# Altium schematic symbol library jlcpcb_2025_04_capacitors_extended_0402.schlib: 3594 symbols (part 9 of 20) (continued)
## CC0402KRX7R8BB151
designator C?  Capacitance: 150pF  (hidden comment: *)
Capacitor, Ceramic (MLCC), 150pF, ±10%, 25V, X7R, ±10%, SMD 0402; Manufacturer: YAGEO; Manufacturer Part Number: CC0402KRX7R8BB151; Package Size: 0402; JLCPCB Basic Part: No; JLCPCB Part Number: C541384; Supplier 1: LCSC; Category: Capacitors - MLCC; Supplier Part Number 1: C541384; Tolerance: ±10%; Voltage Rating: 25V; Temperature Coefficient: X7R; RoHS: Yes; ComponentLink1Description: Datasheet; ComponentLink1URL: https://wmsc.lcsc.com/wmsc/upload/file/pdf/v2/lcsc/2006151112_YAGEO-CC0402KRX7R8BB151_C541384.pdf; ComponentLink2Description: JLCPCB Part URL; ComponentLink2URL: https://jlcpcb.com/partdetail/C541384; ComponentLink3Description: LCSC Part URL; ComponentLink3URL: https://lcsc.com/product-detail/Multilayer-Ceramic-Capacitors-MLCC---SMD-SMT_YAGEO-YAGEO-CC0402KRX7R8BB151_C541384.html
footprint CAP-0402 (0402 (1005M) Capacitor)
pins: 1, 2

## CC0402KRX7R8BB152
designator C?  Capacitance: 1.5nF  (hidden comment: *)
Capacitor, Ceramic (MLCC), 1.5nF, ±10%, 25V, X7R, ±10%, SMD 0402; Manufacturer: YAGEO; Manufacturer Part Number: CC0402KRX7R8BB152; Package Size: 0402; JLCPCB Basic Part: No; JLCPCB Part Number: C541385; Supplier 1: LCSC; Category: Capacitors - MLCC; Supplier Part Number 1: C541385; Tolerance: ±10%; Voltage Rating: 25V; Temperature Coefficient: X7R; RoHS: Yes; ComponentLink1Description: Datasheet; ComponentLink1URL: https://wmsc.lcsc.com/wmsc/upload/file/pdf/v2/lcsc/2006151132_YAGEO-CC0402KRX7R8BB152_C541385.pdf; ComponentLink2Description: JLCPCB Part URL; ComponentLink2URL: https://jlcpcb.com/partdetail/C541385; ComponentLink3Description: LCSC Part URL; ComponentLink3URL: https://lcsc.com/product-detail/Multilayer-Ceramic-Capacitors-MLCC---SMD-SMT_YAGEO-YAGEO-CC0402KRX7R8BB152_C541385.html
footprint CAP-0402 (0402 (1005M) Capacitor)
pins: 1, 2

## CC0402KRX7R8BB153
designator C?  Capacitance: 15nF  (hidden comment: *)
Capacitor, Ceramic (MLCC), 15nF, ±10%, 25V, X7R, ±10%, SMD 0402; Manufacturer: YAGEO; Manufacturer Part Number: CC0402KRX7R8BB153; Package Size: 0402; JLCPCB Basic Part: No; JLCPCB Part Number: C325466; Supplier 1: LCSC; Category: Capacitors - MLCC; Supplier Part Number 1: C325466; Tolerance: ±10%; Voltage Rating: 25V; Temperature Coefficient: X7R; RoHS: Yes; ComponentLink1Description: Datasheet; ComponentLink1URL: https://wmsc.lcsc.com/wmsc/upload/file/pdf/v2/lcsc/1811070918_YAGEO-CC0402KRX7R8BB153_C325466.pdf; ComponentLink2Description: JLCPCB Part URL; ComponentLink2URL: https://jlcpcb.com/partdetail/C325466; ComponentLink3Description: LCSC Part URL; ComponentLink3URL: https://lcsc.com/product-detail/Multilayer-Ceramic-Capacitors-MLCC---SMD-SMT_YAGEO-YAGEO-CC0402KRX7R8BB153_C325466.html
footprint CAP-0402 (0402 (1005M) Capacitor)
pins: 1, 2

## CC0402KRX7R8BB183
designator C?  Capacitance: 18nF  (hidden comment: *)
Capacitor, Ceramic (MLCC), 18nF, ±10%, 25V, X7R, ±10%, SMD 0402; Manufacturer: YAGEO; Manufacturer Part Number: CC0402KRX7R8BB183; Package Size: 0402; JLCPCB Basic Part: No; JLCPCB Part Number: C576736; Supplier 1: LCSC; Category: Capacitors - MLCC; Supplier Part Number 1: C576736; Tolerance: ±10%; Voltage Rating: 25V; Temperature Coefficient: X7R; RoHS: Yes; ComponentLink1Description: Datasheet; ComponentLink1URL: https://wmsc.lcsc.com/wmsc/upload/file/pdf/v2/lcsc/2304140030_YAGEO-CC0402KRX7R8BB183_C576736.pdf; ComponentLink2Description: JLCPCB Part URL; ComponentLink2URL: https://jlcpcb.com/partdetail/C576736; ComponentLink3Description: LCSC Part URL; ComponentLink3URL: https://lcsc.com/product-detail/Multilayer-Ceramic-Capacitors-MLCC---SMD-SMT_YAGEO-YAGEO-CC0402KRX7R8BB183_C576736.html
footprint CAP-0402 (0402 (1005M) Capacitor)
pins: 1, 2

## CC0402KRX7R8BB221
designator C?  Capacitance: 220pF  (hidden comment: *)
Capacitor, Ceramic (MLCC), 220pF, ±10%, 25V, X7R, ±10%, SMD 0402; Manufacturer: YAGEO; Manufacturer Part Number: CC0402KRX7R8BB221; Package Size: 0402; JLCPCB Basic Part: No; JLCPCB Part Number: C1853178; Supplier 1: LCSC; Category: Capacitors - MLCC; Supplier Part Number 1: C1853178; Tolerance: ±10%; Voltage Rating: 25V; Temperature Coefficient: X7R; RoHS: Yes; ComponentLink1Description: Datasheet; ComponentLink1URL: https://wmsc.lcsc.com/wmsc/upload/file/pdf/v2/lcsc/2201271030_YAGEO-CC0402KRX7R8BB221_C1853178.pdf; ComponentLink2Description: JLCPCB Part URL; ComponentLink2URL: https://jlcpcb.com/partdetail/C1853178; ComponentLink3Description: LCSC Part URL; ComponentLink3URL: https://lcsc.com/product-detail/Multilayer-Ceramic-Capacitors-MLCC---SMD-SMT_YAGEO-YAGEO-CC0402KRX7R8BB221_C1853178.html
footprint CAP-0402 (0402 (1005M) Capacitor)
pins: 1, 2

## CC0402KRX7R8BB222
designator C?  Capacitance: 2.2nF  (hidden comment: *)
Capacitor, Ceramic (MLCC), 2.2nF, ±10%, 25V, X7R, ±10%, SMD 0402; Manufacturer: YAGEO; Manufacturer Part Number: CC0402KRX7R8BB222; Package Size: 0402; JLCPCB Basic Part: No; JLCPCB Part Number: C541386; Supplier 1: LCSC; Category: Capacitors - MLCC; Supplier Part Number 1: C541386; Tolerance: ±10%; Voltage Rating: 25V; Temperature Coefficient: X7R; RoHS: Yes; ComponentLink1Description: Datasheet; ComponentLink1URL: https://wmsc.lcsc.com/wmsc/upload/file/pdf/v2/lcsc/2006151132_YAGEO-CC0402KRX7R8BB222_C541386.pdf; ComponentLink2Description: JLCPCB Part URL; ComponentLink2URL: https://jlcpcb.com/partdetail/C541386; ComponentLink3Description: LCSC Part URL; ComponentLink3URL: https://lcsc.com/product-detail/Multilayer-Ceramic-Capacitors-MLCC---SMD-SMT_YAGEO-YAGEO-CC0402KRX7R8BB222_C541386.html
footprint CAP-0402 (0402 (1005M) Capacitor)
pins: 1, 2

## CC0402KRX7R8BB223
designator C?  Capacitance: 22nF  (hidden comment: *)
Capacitor, Ceramic (MLCC), 22nF, ±10%, 25V, X7R, ±10%, SMD 0402; Manufacturer: YAGEO; Manufacturer Part Number: CC0402KRX7R8BB223; Package Size: 0402; JLCPCB Basic Part: No; JLCPCB Part Number: C107019; Supplier 1: LCSC; Category: Capacitors - MLCC; Supplier Part Number 1: C107019; Tolerance: ±10%; Voltage Rating: 25V; Temperature Coefficient: X7R; RoHS: Yes; ComponentLink1Description: Datasheet; ComponentLink1URL: https://wmsc.lcsc.com/wmsc/upload/file/pdf/v2/lcsc/2304140030_YAGEO-CC0402KRX7R8BB223_C107019.pdf; ComponentLink2Description: JLCPCB Part URL; ComponentLink2URL: https://jlcpcb.com/partdetail/C107019; ComponentLink3Description: LCSC Part URL; ComponentLink3URL: https://lcsc.com/product-detail/Multilayer-Ceramic-Capacitors-MLCC---SMD-SMT_YAGEO-YAGEO-CC0402KRX7R8BB223_C107019.html
footprint CAP-0402 (0402 (1005M) Capacitor)
pins: 1, 2

## CC0402KRX7R8BB224
designator C?  Capacitance: 220nF  (hidden comment: *)
Capacitor, Ceramic (MLCC), 220nF, ±10%, 25V, X7R, ±10%, SMD 0402; Manufacturer: YAGEO; Manufacturer Part Number: CC0402KRX7R8BB224; Package Size: 0402; JLCPCB Basic Part: No; JLCPCB Part Number: C723566; Supplier 1: LCSC; Category: Capacitors - MLCC; Supplier Part Number 1: C723566; Tolerance: ±10%; Voltage Rating: 25V; Temperature Coefficient: X7R; RoHS: Yes; ComponentLink1Description: Datasheet; ComponentLink1URL: https://wmsc.lcsc.com/wmsc/upload/file/pdf/v2/lcsc/2201131100_YAGEO-CC0402KRX7R8BB224_C723566.pdf; ComponentLink2Description: JLCPCB Part URL; ComponentLink2URL: https://jlcpcb.com/partdetail/C723566; ComponentLink3Description: LCSC Part URL; ComponentLink3URL: https://lcsc.com/product-detail/Multilayer-Ceramic-Capacitors-MLCC---SMD-SMT_YAGEO-YAGEO-CC0402KRX7R8BB224_C723566.html
footprint CAP-0402 (0402 (1005M) Capacitor)
pins: 1, 2

## CC0402KRX7R8BB272
designator C?  Capacitance: 2.7nF  (hidden comment: *)
Capacitor, Ceramic (MLCC), 2.7nF, ±10%, 25V, X7R, ±10%, SMD 0402; Manufacturer: YAGEO; Manufacturer Part Number: CC0402KRX7R8BB272; Package Size: 0402; JLCPCB Basic Part: No; JLCPCB Part Number: C541392; Supplier 1: LCSC; Category: Capacitors - MLCC; Supplier Part Number 1: C541392; Tolerance: ±10%; Voltage Rating: 25V; Temperature Coefficient: X7R; RoHS: Yes; ComponentLink1Description: Datasheet; ComponentLink1URL: https://wmsc.lcsc.com/wmsc/upload/file/pdf/v2/lcsc/2006151133_YAGEO-CC0402KRX7R8BB272_C541392.pdf; ComponentLink2Description: JLCPCB Part URL; ComponentLink2URL: https://jlcpcb.com/partdetail/C541392; ComponentLink3Description: LCSC Part URL; ComponentLink3URL: https://lcsc.com/product-detail/Multilayer-Ceramic-Capacitors-MLCC---SMD-SMT_YAGEO-YAGEO-CC0402KRX7R8BB272_C541392.html
footprint CAP-0402 (0402 (1005M) Capacitor)
pins: 1, 2

## CC0402KRX7R8BB273
designator C?  Capacitance: 27nF  (hidden comment: *)
Capacitor, Ceramic (MLCC), 27nF, ±10%, 25V, X7R, ±10%, SMD 0402; Manufacturer: YAGEO; Manufacturer Part Number: CC0402KRX7R8BB273; Package Size: 0402; JLCPCB Basic Part: No; JLCPCB Part Number: C513396; Supplier 1: LCSC; Category: Capacitors - MLCC; Supplier Part Number 1: C513396; Tolerance: ±10%; Voltage Rating: 25V; Temperature Coefficient: X7R; RoHS: Yes; ComponentLink1Description: Datasheet; ComponentLink1URL: https://wmsc.lcsc.com/wmsc/upload/file/pdf/v2/lcsc/2004231432_YAGEO-CC0402KRX7R8BB273_C513396.pdf; ComponentLink2Description: JLCPCB Part URL; ComponentLink2URL: https://jlcpcb.com/partdetail/C513396; ComponentLink3Description: LCSC Part URL; ComponentLink3URL: https://lcsc.com/product-detail/Multilayer-Ceramic-Capacitors-MLCC---SMD-SMT_YAGEO-YAGEO-CC0402KRX7R8BB273_C513396.html
footprint CAP-0402 (0402 (1005M) Capacitor)
pins: 1, 2

## CC0402KRX7R8BB332
designator C?  Capacitance: 3.3nF  (hidden comment: *)
Capacitor, Ceramic (MLCC), 3.3nF, ±10%, 25V, X7R, ±10%, SMD 0402; Manufacturer: YAGEO; Manufacturer Part Number: CC0402KRX7R8BB332; Package Size: 0402; JLCPCB Basic Part: No; JLCPCB Part Number: C272874; Supplier 1: LCSC; Category: Capacitors - MLCC; Supplier Part Number 1: C272874; Tolerance: ±10%; Voltage Rating: 25V; Temperature Coefficient: X7R; RoHS: Yes; ComponentLink1Description: Datasheet; ComponentLink1URL: https://wmsc.lcsc.com/wmsc/upload/file/pdf/v2/lcsc/2304140030_YAGEO-CC0402KRX7R8BB332_C272874.pdf; ComponentLink2Description: JLCPCB Part URL; ComponentLink2URL: https://jlcpcb.com/partdetail/C272874; ComponentLink3Description: LCSC Part URL; ComponentLink3URL: https://lcsc.com/product-detail/Multilayer-Ceramic-Capacitors-MLCC---SMD-SMT_YAGEO-YAGEO-CC0402KRX7R8BB332_C272874.html
footprint CAP-0402 (0402 (1005M) Capacitor)
pins: 1, 2

## CC0402KRX7R8BB333
designator C?  Capacitance: 33nF  (hidden comment: *)
Capacitor, Ceramic (MLCC), 33nF, ±10%, 25V, X7R, ±10%, SMD 0402; Manufacturer: YAGEO; Manufacturer Part Number: CC0402KRX7R8BB333; Package Size: 0402; JLCPCB Basic Part: No; JLCPCB Part Number: C326974; Supplier 1: LCSC; Category: Capacitors - MLCC; Supplier Part Number 1: C326974; Tolerance: ±10%; Voltage Rating: 25V; Temperature Coefficient: X7R; RoHS: Yes; ComponentLink1Description: Datasheet; ComponentLink1URL: https://wmsc.lcsc.com/wmsc/upload/file/pdf/v2/lcsc/1811141234_YAGEO-CC0402KRX7R8BB333_C326974.pdf; ComponentLink2Description: JLCPCB Part URL; ComponentLink2URL: https://jlcpcb.com/partdetail/C326974; ComponentLink3Description: LCSC Part URL; ComponentLink3URL: https://lcsc.com/product-detail/Multilayer-Ceramic-Capacitors-MLCC---SMD-SMT_YAGEO-YAGEO-CC0402KRX7R8BB333_C326974.html
footprint CAP-0402 (0402 (1005M) Capacitor)
pins: 1, 2

## CC0402KRX7R8BB392
designator C?  Capacitance: 3.9nF  (hidden comment: *)
Capacitor, Ceramic (MLCC), 3.9nF, ±10%, 25V, X7R, ±10%, SMD 0402; Manufacturer: YAGEO; Manufacturer Part Number: CC0402KRX7R8BB392; Package Size: 0402; JLCPCB Basic Part: No; JLCPCB Part Number: C113787; Supplier 1: LCSC; Category: Capacitors - MLCC; Supplier Part Number 1: C113787; Tolerance: ±10%; Voltage Rating: 25V; Temperature Coefficient: X7R; RoHS: Yes; ComponentLink1Description: Datasheet; ComponentLink1URL: https://wmsc.lcsc.com/wmsc/upload/file/pdf/v2/lcsc/2304140030_YAGEO-CC0402KRX7R8BB392_C113787.pdf; ComponentLink2Description: JLCPCB Part URL; ComponentLink2URL: https://jlcpcb.com/partdetail/C113787; ComponentLink3Description: LCSC Part URL; ComponentLink3URL: https://lcsc.com/product-detail/Multilayer-Ceramic-Capacitors-MLCC---SMD-SMT_YAGEO-YAGEO-CC0402KRX7R8BB392_C113787.html
footprint CAP-0402 (0402 (1005M) Capacitor)
pins: 1, 2

## CC0402KRX7R8BB393
designator C?  Capacitance: 39nF  (hidden comment: *)
Capacitor, Ceramic (MLCC), 39nF, ±10%, 25V, X7R, ±10%, SMD 0402; Manufacturer: YAGEO; Manufacturer Part Number: CC0402KRX7R8BB393; Package Size: 0402; JLCPCB Basic Part: No; JLCPCB Part Number: C576737; Supplier 1: LCSC; Category: Capacitors - MLCC; Supplier Part Number 1: C576737; Tolerance: ±10%; Voltage Rating: 25V; Temperature Coefficient: X7R; RoHS: Yes; ComponentLink1Description: Datasheet; ComponentLink1URL: https://wmsc.lcsc.com/wmsc/upload/file/pdf/v2/lcsc/2204021130_YAGEO-CC0402KRX7R8BB393_C576737.pdf; ComponentLink2Description: JLCPCB Part URL; ComponentLink2URL: https://jlcpcb.com/partdetail/C576737; ComponentLink3Description: LCSC Part URL; ComponentLink3URL: https://lcsc.com/product-detail/Multilayer-Ceramic-Capacitors-MLCC---SMD-SMT_YAGEO-YAGEO-CC0402KRX7R8BB393_C576737.html
footprint CAP-0402 (0402 (1005M) Capacitor)
pins: 1, 2

## CC0402KRX7R8BB471
designator C?  Capacitance: 470pF  (hidden comment: *)
Capacitor, Ceramic (MLCC), 470pF, ±10%, 25V, X7R, ±10%, SMD 0402; Manufacturer: YAGEO; Manufacturer Part Number: CC0402KRX7R8BB471; Package Size: 0402; JLCPCB Basic Part: No; JLCPCB Part Number: C541387; Supplier 1: LCSC; Category: Capacitors - MLCC; Supplier Part Number 1: C541387; Tolerance: ±10%; Voltage Rating: 25V; Temperature Coefficient: X7R; RoHS: Yes; ComponentLink1Description: Datasheet; ComponentLink1URL: https://wmsc.lcsc.com/wmsc/upload/file/pdf/v2/lcsc/2006151132_YAGEO-CC0402KRX7R8BB471_C541387.pdf; ComponentLink2Description: JLCPCB Part URL; ComponentLink2URL: https://jlcpcb.com/partdetail/C541387; ComponentLink3Description: LCSC Part URL; ComponentLink3URL: https://lcsc.com/product-detail/Multilayer-Ceramic-Capacitors-MLCC---SMD-SMT_YAGEO-YAGEO-CC0402KRX7R8BB471_C541387.html
footprint CAP-0402 (0402 (1005M) Capacitor)
pins: 1, 2

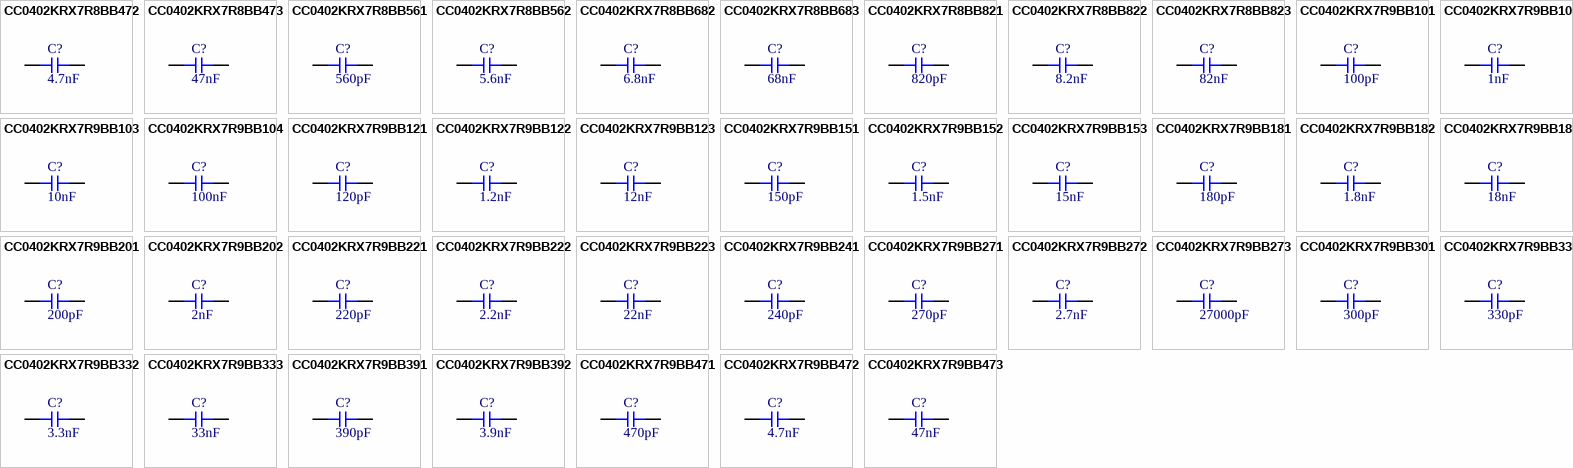
[diagram p40: symbols CC0402KRX7R8BB472 to CC0402KRX7R9BB473]

## CC0402KRX7R8BB472
designator C?  Capacitance: 4.7nF  (hidden comment: *)
Capacitor, Ceramic (MLCC), 4.7nF, ±10%, 25V, X7R, ±10%, SMD 0402; Manufacturer: YAGEO; Manufacturer Part Number: CC0402KRX7R8BB472; Package Size: 0402; JLCPCB Basic Part: No; JLCPCB Part Number: C181747; Supplier 1: LCSC; Category: Capacitors - MLCC; Supplier Part Number 1: C181747; Tolerance: ±10%; Voltage Rating: 25V; Temperature Coefficient: X7R; RoHS: Yes; ComponentLink1Description: Datasheet; ComponentLink1URL: https://wmsc.lcsc.com/wmsc/upload/file/pdf/v2/lcsc/1811091032_YAGEO-CC0402KRX7R8BB472_C181747.pdf; ComponentLink2Description: JLCPCB Part URL; ComponentLink2URL: https://jlcpcb.com/partdetail/C181747; ComponentLink3Description: LCSC Part URL; ComponentLink3URL: https://lcsc.com/product-detail/Multilayer-Ceramic-Capacitors-MLCC---SMD-SMT_YAGEO-YAGEO-CC0402KRX7R8BB472_C181747.html
footprint CAP-0402 (0402 (1005M) Capacitor)
pins: 1, 2

## CC0402KRX7R8BB473
designator C?  Capacitance: 47nF  (hidden comment: *)
Capacitor, Ceramic (MLCC), 47nF, ±10%, 25V, X7R, ±10%, SMD 0402; Manufacturer: YAGEO; Manufacturer Part Number: CC0402KRX7R8BB473; Package Size: 0402; JLCPCB Basic Part: No; JLCPCB Part Number: C107020; Supplier 1: LCSC; Category: Capacitors - MLCC; Supplier Part Number 1: C107020; Tolerance: ±10%; Voltage Rating: 25V; Temperature Coefficient: X7R; RoHS: Yes; ComponentLink1Description: Datasheet; ComponentLink1URL: https://wmsc.lcsc.com/wmsc/upload/file/pdf/v2/lcsc/2304140030_YAGEO-CC0402KRX7R8BB473_C107020.pdf; ComponentLink2Description: JLCPCB Part URL; ComponentLink2URL: https://jlcpcb.com/partdetail/C107020; ComponentLink3Description: LCSC Part URL; ComponentLink3URL: https://lcsc.com/product-detail/Multilayer-Ceramic-Capacitors-MLCC---SMD-SMT_YAGEO-YAGEO-CC0402KRX7R8BB473_C107020.html
footprint CAP-0402 (0402 (1005M) Capacitor)
pins: 1, 2

## CC0402KRX7R8BB561
designator C?  Capacitance: 560pF  (hidden comment: *)
Capacitor, Ceramic (MLCC), 560pF, ±10%, 25V, X7R, ±10%, SMD 0402; Manufacturer: YAGEO; Manufacturer Part Number: CC0402KRX7R8BB561; Package Size: 0402; JLCPCB Basic Part: No; JLCPCB Part Number: C527016; Supplier 1: LCSC; Category: Capacitors - MLCC; Supplier Part Number 1: C527016; Tolerance: ±10%; Voltage Rating: 25V; Temperature Coefficient: X7R; RoHS: Yes; ComponentLink1Description: Datasheet; ComponentLink1URL: https://wmsc.lcsc.com/wmsc/upload/file/pdf/v2/lcsc/2006031835_YAGEO-CC0402KRX7R8BB561_C527016.pdf; ComponentLink2Description: JLCPCB Part URL; ComponentLink2URL: https://jlcpcb.com/partdetail/C527016; ComponentLink3Description: LCSC Part URL; ComponentLink3URL: https://lcsc.com/product-detail/Multilayer-Ceramic-Capacitors-MLCC---SMD-SMT_YAGEO-YAGEO-CC0402KRX7R8BB561_C527016.html
footprint CAP-0402 (0402 (1005M) Capacitor)
pins: 1, 2

## CC0402KRX7R8BB562
designator C?  Capacitance: 5.6nF  (hidden comment: *)
Capacitor, Ceramic (MLCC), 5.6nF, ±10%, 25V, X7R, ±10%, SMD 0402; Manufacturer: YAGEO; Manufacturer Part Number: CC0402KRX7R8BB562; Package Size: 0402; JLCPCB Basic Part: No; JLCPCB Part Number: C527017; Supplier 1: LCSC; Category: Capacitors - MLCC; Supplier Part Number 1: C527017; Tolerance: ±10%; Voltage Rating: 25V; Temperature Coefficient: X7R; RoHS: Yes; ComponentLink1Description: Datasheet; ComponentLink1URL: https://wmsc.lcsc.com/wmsc/upload/file/pdf/v2/lcsc/2007091834_YAGEO-CC0402KRX7R8BB562_C527017.pdf; ComponentLink2Description: JLCPCB Part URL; ComponentLink2URL: https://jlcpcb.com/partdetail/C527017; ComponentLink3Description: LCSC Part URL; ComponentLink3URL: https://lcsc.com/product-detail/Multilayer-Ceramic-Capacitors-MLCC---SMD-SMT_YAGEO-YAGEO-CC0402KRX7R8BB562_C527017.html
footprint CAP-0402 (0402 (1005M) Capacitor)
pins: 1, 2

## CC0402KRX7R8BB682
designator C?  Capacitance: 6.8nF  (hidden comment: *)
Capacitor, Ceramic (MLCC), 6.8nF, ±10%, 25V, X7R, ±10%, SMD 0402; Manufacturer: YAGEO; Manufacturer Part Number: CC0402KRX7R8BB682; Package Size: 0402; JLCPCB Basic Part: No; JLCPCB Part Number: C541388; Supplier 1: LCSC; Category: Capacitors - MLCC; Supplier Part Number 1: C541388; Tolerance: ±10%; Voltage Rating: 25V; Temperature Coefficient: X7R; RoHS: Yes; ComponentLink1Description: Datasheet; ComponentLink1URL: https://wmsc.lcsc.com/wmsc/upload/file/pdf/v2/lcsc/2006151132_YAGEO-CC0402KRX7R8BB682_C541388.pdf; ComponentLink2Description: JLCPCB Part URL; ComponentLink2URL: https://jlcpcb.com/partdetail/C541388; ComponentLink3Description: LCSC Part URL; ComponentLink3URL: https://lcsc.com/product-detail/Multilayer-Ceramic-Capacitors-MLCC---SMD-SMT_YAGEO-YAGEO-CC0402KRX7R8BB682_C541388.html
footprint CAP-0402 (0402 (1005M) Capacitor)
pins: 1, 2

## CC0402KRX7R8BB683
designator C?  Capacitance: 68nF  (hidden comment: *)
Capacitor, Ceramic (MLCC), 68nF, ±10%, 25V, X7R, ±10%, SMD 0402; Manufacturer: YAGEO; Manufacturer Part Number: CC0402KRX7R8BB683; Package Size: 0402; JLCPCB Basic Part: No; JLCPCB Part Number: C325467; Supplier 1: LCSC; Category: Capacitors - MLCC; Supplier Part Number 1: C325467; Tolerance: ±10%; Voltage Rating: 25V; Temperature Coefficient: X7R; RoHS: Yes; ComponentLink1Description: Datasheet; ComponentLink1URL: https://wmsc.lcsc.com/wmsc/upload/file/pdf/v2/lcsc/1811070918_YAGEO-CC0402KRX7R8BB683_C325467.pdf; ComponentLink2Description: JLCPCB Part URL; ComponentLink2URL: https://jlcpcb.com/partdetail/C325467; ComponentLink3Description: LCSC Part URL; ComponentLink3URL: https://lcsc.com/product-detail/Multilayer-Ceramic-Capacitors-MLCC---SMD-SMT_YAGEO-YAGEO-CC0402KRX7R8BB683_C325467.html
footprint CAP-0402 (0402 (1005M) Capacitor)
pins: 1, 2

## CC0402KRX7R8BB821
designator C?  Capacitance: 820pF  (hidden comment: *)
Capacitor, Ceramic (MLCC), 820pF, ±10%, 25V, X7R, ±10%, SMD 0402; Manufacturer: YAGEO; Manufacturer Part Number: CC0402KRX7R8BB821; Package Size: 0402; JLCPCB Basic Part: No; JLCPCB Part Number: C527018; Supplier 1: LCSC; Category: Capacitors - MLCC; Supplier Part Number 1: C527018; Tolerance: ±10%; Voltage Rating: 25V; Temperature Coefficient: X7R; RoHS: Yes; ComponentLink1Description: Datasheet; ComponentLink1URL: https://wmsc.lcsc.com/wmsc/upload/file/pdf/v2/lcsc/2006101834_YAGEO-CC0402KRX7R8BB821_C527018.pdf; ComponentLink2Description: JLCPCB Part URL; ComponentLink2URL: https://jlcpcb.com/partdetail/C527018; ComponentLink3Description: LCSC Part URL; ComponentLink3URL: https://lcsc.com/product-detail/Multilayer-Ceramic-Capacitors-MLCC---SMD-SMT_YAGEO-YAGEO-CC0402KRX7R8BB821_C527018.html
footprint CAP-0402 (0402 (1005M) Capacitor)
pins: 1, 2

## CC0402KRX7R8BB822
designator C?  Capacitance: 8.2nF  (hidden comment: *)
Capacitor, Ceramic (MLCC), 8.2nF, ±10%, 25V, X7R, ±10%, SMD 0402; Manufacturer: YAGEO; Manufacturer Part Number: CC0402KRX7R8BB822; Package Size: 0402; JLCPCB Basic Part: No; JLCPCB Part Number: C527019; Supplier 1: LCSC; Category: Capacitors - MLCC; Supplier Part Number 1: C527019; Tolerance: ±10%; Voltage Rating: 25V; Temperature Coefficient: X7R; RoHS: Yes; ComponentLink1Description: Datasheet; ComponentLink1URL: https://wmsc.lcsc.com/wmsc/upload/file/pdf/v2/lcsc/2006031835_YAGEO-CC0402KRX7R8BB822_C527019.pdf; ComponentLink2Description: JLCPCB Part URL; ComponentLink2URL: https://jlcpcb.com/partdetail/C527019; ComponentLink3Description: LCSC Part URL; ComponentLink3URL: https://lcsc.com/product-detail/Multilayer-Ceramic-Capacitors-MLCC---SMD-SMT_YAGEO-YAGEO-CC0402KRX7R8BB822_C527019.html
footprint CAP-0402 (0402 (1005M) Capacitor)
pins: 1, 2

## CC0402KRX7R8BB823
designator C?  Capacitance: 82nF  (hidden comment: *)
Capacitor, Ceramic (MLCC), 82nF, ±10%, 25V, X7R, ±10%, SMD 0402; Manufacturer: YAGEO; Manufacturer Part Number: CC0402KRX7R8BB823; Package Size: 0402; JLCPCB Basic Part: No; JLCPCB Part Number: C576738; Supplier 1: LCSC; Category: Capacitors - MLCC; Supplier Part Number 1: C576738; Tolerance: ±10%; Voltage Rating: 25V; Temperature Coefficient: X7R; RoHS: Yes; ComponentLink1Description: Datasheet; ComponentLink1URL: https://wmsc.lcsc.com/wmsc/upload/file/pdf/v2/lcsc/2009261808_YAGEO-CC0402KRX7R8BB823_C576738.pdf; ComponentLink2Description: JLCPCB Part URL; ComponentLink2URL: https://jlcpcb.com/partdetail/C576738; ComponentLink3Description: LCSC Part URL; ComponentLink3URL: https://lcsc.com/product-detail/Multilayer-Ceramic-Capacitors-MLCC---SMD-SMT_YAGEO-YAGEO-CC0402KRX7R8BB823_C576738.html
footprint CAP-0402 (0402 (1005M) Capacitor)
pins: 1, 2

## CC0402KRX7R9BB101
designator C?  Capacitance: 100pF  (hidden comment: *)
Capacitor, Ceramic (MLCC), 100pF, ±10%, 50V, X7R, ±10%, SMD 0402; Manufacturer: YAGEO; Manufacturer Part Number: CC0402KRX7R9BB101; Package Size: 0402; JLCPCB Basic Part: No; JLCPCB Part Number: C281751; Supplier 1: LCSC; Category: Capacitors - MLCC; Supplier Part Number 1: C281751; Tolerance: ±10%; Voltage Rating: 50V; Temperature Coefficient: X7R; RoHS: Yes; ComponentLink1Description: Datasheet; ComponentLink1URL: https://wmsc.lcsc.com/wmsc/upload/file/pdf/v2/lcsc/2304140030_YAGEO-CC0402KRX7R9BB101_C281751.pdf; ComponentLink2Description: JLCPCB Part URL; ComponentLink2URL: https://jlcpcb.com/partdetail/C281751; ComponentLink3Description: LCSC Part URL; ComponentLink3URL: https://lcsc.com/product-detail/Multilayer-Ceramic-Capacitors-MLCC---SMD-SMT_YAGEO-YAGEO-CC0402KRX7R9BB101_C281751.html
footprint CAP-0402 (0402 (1005M) Capacitor)
pins: 1, 2

## CC0402KRX7R9BB102
designator C?  Capacitance: 1nF  (hidden comment: *)
Capacitor, Ceramic (MLCC), 1nF, ±10%, 50V, X7R, ±10%, SMD 0402; Manufacturer: YAGEO; Manufacturer Part Number: CC0402KRX7R9BB102; Package Size: 0402; JLCPCB Basic Part: No; JLCPCB Part Number: C106205; Supplier 1: LCSC; Category: Capacitors - MLCC; Supplier Part Number 1: C106205; Tolerance: ±10%; Voltage Rating: 50V; Temperature Coefficient: X7R; RoHS: Yes; ComponentLink1Description: Datasheet; ComponentLink1URL: https://wmsc.lcsc.com/wmsc/upload/file/pdf/v2/lcsc/2304140030_YAGEO-CC0402KRX7R9BB102_C106205.pdf; ComponentLink2Description: JLCPCB Part URL; ComponentLink2URL: https://jlcpcb.com/partdetail/C106205; ComponentLink3Description: LCSC Part URL; ComponentLink3URL: https://lcsc.com/product-detail/Multilayer-Ceramic-Capacitors-MLCC---SMD-SMT_YAGEO-YAGEO-CC0402KRX7R9BB102_C106205.html
footprint CAP-0402 (0402 (1005M) Capacitor)
pins: 1, 2

## CC0402KRX7R9BB103
designator C?  Capacitance: 10nF  (hidden comment: *)
Capacitor, Ceramic (MLCC), 10nF, ±10%, 50V, X7R, ±10%, SMD 0402; Manufacturer: YAGEO; Manufacturer Part Number: CC0402KRX7R9BB103; Package Size: 0402; JLCPCB Basic Part: No; JLCPCB Part Number: C60133; Supplier 1: LCSC; Category: Capacitors - MLCC; Supplier Part Number 1: C60133; Tolerance: ±10%; Voltage Rating: 50V; Temperature Coefficient: X7R; RoHS: Yes; ComponentLink1Description: Datasheet; ComponentLink1URL: https://wmsc.lcsc.com/wmsc/upload/file/pdf/v2/lcsc/2304140030_YAGEO-CC0402KRX7R9BB103_C60133.pdf; ComponentLink2Description: JLCPCB Part URL; ComponentLink2URL: https://jlcpcb.com/partdetail/C60133; ComponentLink3Description: LCSC Part URL; ComponentLink3URL: https://lcsc.com/product-detail/Multilayer-Ceramic-Capacitors-MLCC---SMD-SMT_YAGEO-YAGEO-CC0402KRX7R9BB103_C60133.html
footprint CAP-0402 (0402 (1005M) Capacitor)
pins: 1, 2

## CC0402KRX7R9BB104
designator C?  Capacitance: 100nF  (hidden comment: *)
Capacitor, Ceramic (MLCC), 100nF, ±10%, 50V, X7R, ±10%, SMD 0402; Manufacturer: YAGEO; Manufacturer Part Number: CC0402KRX7R9BB104; Package Size: 0402; JLCPCB Basic Part: No; JLCPCB Part Number: C131394; Supplier 1: LCSC; Category: Capacitors - MLCC; Supplier Part Number 1: C131394; Tolerance: ±10%; Voltage Rating: 50V; Temperature Coefficient: X7R; RoHS: Yes; ComponentLink1Description: Datasheet; ComponentLink1URL: https://wmsc.lcsc.com/wmsc/upload/file/pdf/v2/lcsc/2304140030_YAGEO-CC0402KRX7R9BB104_C131394.pdf; ComponentLink2Description: JLCPCB Part URL; ComponentLink2URL: https://jlcpcb.com/partdetail/C131394; ComponentLink3Description: LCSC Part URL; ComponentLink3URL: https://lcsc.com/product-detail/Multilayer-Ceramic-Capacitors-MLCC---SMD-SMT_YAGEO-YAGEO-CC0402KRX7R9BB104_C131394.html
footprint CAP-0402 (0402 (1005M) Capacitor)
pins: 1, 2

## CC0402KRX7R9BB121
designator C?  Capacitance: 120pF  (hidden comment: *)
Capacitor, Ceramic (MLCC), 120pF, ±10%, 50V, X7R, ±10%, SMD 0402; Manufacturer: YAGEO; Manufacturer Part Number: CC0402KRX7R9BB121; Package Size: 0402; JLCPCB Basic Part: No; JLCPCB Part Number: C113788; Supplier 1: LCSC; Category: Capacitors - MLCC; Supplier Part Number 1: C113788; Tolerance: ±10%; Voltage Rating: 50V; Temperature Coefficient: X7R; RoHS: Yes; ComponentLink1Description: Datasheet; ComponentLink1URL: https://wmsc.lcsc.com/wmsc/upload/file/pdf/v2/lcsc/2304140030_YAGEO-CC0402KRX7R9BB121_C113788.pdf; ComponentLink2Description: JLCPCB Part URL; ComponentLink2URL: https://jlcpcb.com/partdetail/C113788; ComponentLink3Description: LCSC Part URL; ComponentLink3URL: https://lcsc.com/product-detail/Multilayer-Ceramic-Capacitors-MLCC---SMD-SMT_YAGEO-YAGEO-CC0402KRX7R9BB121_C113788.html
footprint CAP-0402 (0402 (1005M) Capacitor)
pins: 1, 2

## CC0402KRX7R9BB122
designator C?  Capacitance: 1.2nF  (hidden comment: *)
Capacitor, Ceramic (MLCC), 1.2nF, ±10%, 50V, X7R, ±10%, SMD 0402; Manufacturer: YAGEO; Manufacturer Part Number: CC0402KRX7R9BB122; Package Size: 0402; JLCPCB Basic Part: No; JLCPCB Part Number: C107021; Supplier 1: LCSC; Category: Capacitors - MLCC; Supplier Part Number 1: C107021; Tolerance: ±10%; Voltage Rating: 50V; Temperature Coefficient: X7R; RoHS: Yes; ComponentLink1Description: Datasheet; ComponentLink1URL: https://wmsc.lcsc.com/wmsc/upload/file/pdf/v2/lcsc/2304140030_YAGEO-CC0402KRX7R9BB122_C107021.pdf; ComponentLink2Description: JLCPCB Part URL; ComponentLink2URL: https://jlcpcb.com/partdetail/C107021; ComponentLink3Description: LCSC Part URL; ComponentLink3URL: https://lcsc.com/product-detail/Multilayer-Ceramic-Capacitors-MLCC---SMD-SMT_YAGEO-YAGEO-CC0402KRX7R9BB122_C107021.html
footprint CAP-0402 (0402 (1005M) Capacitor)
pins: 1, 2

## CC0402KRX7R9BB123
designator C?  Capacitance: 12nF  (hidden comment: *)
Capacitor, Ceramic (MLCC), 12nF, ±10%, 50V, X7R, ±10%, SMD 0402; Manufacturer: YAGEO; Manufacturer Part Number: CC0402KRX7R9BB123; Package Size: 0402; JLCPCB Basic Part: No; JLCPCB Part Number: C576739; Supplier 1: LCSC; Category: Capacitors - MLCC; Supplier Part Number 1: C576739; Tolerance: ±10%; Voltage Rating: 50V; Temperature Coefficient: X7R; RoHS: Yes; ComponentLink1Description: Datasheet; ComponentLink1URL: https://wmsc.lcsc.com/wmsc/upload/file/pdf/v2/lcsc/2204021130_YAGEO-CC0402KRX7R9BB123_C576739.pdf; ComponentLink2Description: JLCPCB Part URL; ComponentLink2URL: https://jlcpcb.com/partdetail/C576739; ComponentLink3Description: LCSC Part URL; ComponentLink3URL: https://lcsc.com/product-detail/Multilayer-Ceramic-Capacitors-MLCC---SMD-SMT_YAGEO-YAGEO-CC0402KRX7R9BB123_C576739.html
footprint CAP-0402 (0402 (1005M) Capacitor)
pins: 1, 2

## CC0402KRX7R9BB151
designator C?  Capacitance: 150pF  (hidden comment: *)
Capacitor, Ceramic (MLCC), 150pF, ±10%, 50V, X7R, ±10%, SMD 0402; Manufacturer: YAGEO; Manufacturer Part Number: CC0402KRX7R9BB151; Package Size: 0402; JLCPCB Basic Part: No; JLCPCB Part Number: C113789; Supplier 1: LCSC; Category: Capacitors - MLCC; Supplier Part Number 1: C113789; Tolerance: ±10%; Voltage Rating: 50V; Temperature Coefficient: X7R; RoHS: Yes; ComponentLink1Description: Datasheet; ComponentLink1URL: https://wmsc.lcsc.com/wmsc/upload/file/pdf/v2/lcsc/2304140030_YAGEO-CC0402KRX7R9BB151_C113789.pdf; ComponentLink2Description: JLCPCB Part URL; ComponentLink2URL: https://jlcpcb.com/partdetail/C113789; ComponentLink3Description: LCSC Part URL; ComponentLink3URL: https://lcsc.com/product-detail/Multilayer-Ceramic-Capacitors-MLCC---SMD-SMT_YAGEO-YAGEO-CC0402KRX7R9BB151_C113789.html
footprint CAP-0402 (0402 (1005M) Capacitor)
pins: 1, 2

## CC0402KRX7R9BB152
designator C?  Capacitance: 1.5nF  (hidden comment: *)
Capacitor, Ceramic (MLCC), 1.5nF, ±10%, 50V, X7R, ±10%, SMD 0402; Manufacturer: YAGEO; Manufacturer Part Number: CC0402KRX7R9BB152; Package Size: 0402; JLCPCB Basic Part: No; JLCPCB Part Number: C107022; Supplier 1: LCSC; Category: Capacitors - MLCC; Supplier Part Number 1: C107022; Tolerance: ±10%; Voltage Rating: 50V; Temperature Coefficient: X7R; RoHS: Yes; ComponentLink1Description: Datasheet; ComponentLink1URL: https://wmsc.lcsc.com/wmsc/upload/file/pdf/v2/lcsc/2304140030_YAGEO-CC0402KRX7R9BB152_C107022.pdf; ComponentLink2Description: JLCPCB Part URL; ComponentLink2URL: https://jlcpcb.com/partdetail/C107022; ComponentLink3Description: LCSC Part URL; ComponentLink3URL: https://lcsc.com/product-detail/Multilayer-Ceramic-Capacitors-MLCC---SMD-SMT_YAGEO-YAGEO-CC0402KRX7R9BB152_C107022.html
footprint CAP-0402 (0402 (1005M) Capacitor)
pins: 1, 2

## CC0402KRX7R9BB153
designator C?  Capacitance: 15nF  (hidden comment: *)
Capacitor, Ceramic (MLCC), 15nF, ±10%, 50V, X7R, ±10%, SMD 0402; Manufacturer: YAGEO; Manufacturer Part Number: CC0402KRX7R9BB153; Package Size: 0402; JLCPCB Basic Part: No; JLCPCB Part Number: C114405; Supplier 1: LCSC; Category: Capacitors - MLCC; Supplier Part Number 1: C114405; Tolerance: ±10%; Voltage Rating: 50V; Temperature Coefficient: X7R; RoHS: Yes; ComponentLink1Description: Datasheet; ComponentLink1URL: https://wmsc.lcsc.com/wmsc/upload/file/pdf/v2/lcsc/2304140030_YAGEO-CC0402KRX7R9BB153_C114405.pdf; ComponentLink2Description: JLCPCB Part URL; ComponentLink2URL: https://jlcpcb.com/partdetail/C114405; ComponentLink3Description: LCSC Part URL; ComponentLink3URL: https://lcsc.com/product-detail/Multilayer-Ceramic-Capacitors-MLCC---SMD-SMT_YAGEO-YAGEO-CC0402KRX7R9BB153_C114405.html
footprint CAP-0402 (0402 (1005M) Capacitor)
pins: 1, 2

## CC0402KRX7R9BB181
designator C?  Capacitance: 180pF  (hidden comment: *)
Capacitor, Ceramic (MLCC), 180pF, ±10%, 50V, X7R, ±10%, SMD 0402; Manufacturer: YAGEO; Manufacturer Part Number: CC0402KRX7R9BB181; Package Size: 0402; JLCPCB Basic Part: No; JLCPCB Part Number: C107023; Supplier 1: LCSC; Category: Capacitors - MLCC; Supplier Part Number 1: C107023; Tolerance: ±10%; Voltage Rating: 50V; Temperature Coefficient: X7R; RoHS: Yes; ComponentLink1Description: Datasheet; ComponentLink1URL: https://wmsc.lcsc.com/wmsc/upload/file/pdf/v2/lcsc/2304140030_YAGEO-CC0402KRX7R9BB181_C107023.pdf; ComponentLink2Description: JLCPCB Part URL; ComponentLink2URL: https://jlcpcb.com/partdetail/C107023; ComponentLink3Description: LCSC Part URL; ComponentLink3URL: https://lcsc.com/product-detail/Multilayer-Ceramic-Capacitors-MLCC---SMD-SMT_YAGEO-YAGEO-CC0402KRX7R9BB181_C107023.html
footprint CAP-0402 (0402 (1005M) Capacitor)
pins: 1, 2

## CC0402KRX7R9BB182
designator C?  Capacitance: 1.8nF  (hidden comment: *)
Capacitor, Ceramic (MLCC), 1.8nF, ±10%, 50V, X7R, ±10%, SMD 0402; Manufacturer: YAGEO; Manufacturer Part Number: CC0402KRX7R9BB182; Package Size: 0402; JLCPCB Basic Part: No; JLCPCB Part Number: C107024; Supplier 1: LCSC; Category: Capacitors - MLCC; Supplier Part Number 1: C107024; Tolerance: ±10%; Voltage Rating: 50V; Temperature Coefficient: X7R; RoHS: Yes; ComponentLink1Description: Datasheet; ComponentLink1URL: https://wmsc.lcsc.com/wmsc/upload/file/pdf/v2/lcsc/2304140030_YAGEO-CC0402KRX7R9BB182_C107024.pdf; ComponentLink2Description: JLCPCB Part URL; ComponentLink2URL: https://jlcpcb.com/partdetail/C107024; ComponentLink3Description: LCSC Part URL; ComponentLink3URL: https://lcsc.com/product-detail/Multilayer-Ceramic-Capacitors-MLCC---SMD-SMT_YAGEO-YAGEO-CC0402KRX7R9BB182_C107024.html
footprint CAP-0402 (0402 (1005M) Capacitor)
pins: 1, 2

## CC0402KRX7R9BB183
designator C?  Capacitance: 18nF  (hidden comment: *)
Capacitor, Ceramic (MLCC), 18nF, ±10%, 50V, X7R, ±10%, SMD 0402; Manufacturer: YAGEO; Manufacturer Part Number: CC0402KRX7R9BB183; Package Size: 0402; JLCPCB Basic Part: No; JLCPCB Part Number: C576740; Supplier 1: LCSC; Category: Capacitors - MLCC; Supplier Part Number 1: C576740; Tolerance: ±10%; Voltage Rating: 50V; Temperature Coefficient: X7R; RoHS: Yes; ComponentLink1Description: Datasheet; ComponentLink1URL: https://wmsc.lcsc.com/wmsc/upload/file/pdf/v2/lcsc/2201041830_YAGEO-CC0402KRX7R9BB183_C576740.pdf; ComponentLink2Description: JLCPCB Part URL; ComponentLink2URL: https://jlcpcb.com/partdetail/C576740; ComponentLink3Description: LCSC Part URL; ComponentLink3URL: https://lcsc.com/product-detail/Multilayer-Ceramic-Capacitors-MLCC---SMD-SMT_YAGEO-YAGEO-CC0402KRX7R9BB183_C576740.html
footprint CAP-0402 (0402 (1005M) Capacitor)
pins: 1, 2

## CC0402KRX7R9BB201
designator C?  Capacitance: 200pF  (hidden comment: *)
Capacitor, Ceramic (MLCC), 200pF, ±10%, 50V, X7R, ±10%, SMD 0402; Manufacturer: YAGEO; Manufacturer Part Number: CC0402KRX7R9BB201; Package Size: 0402; JLCPCB Basic Part: No; JLCPCB Part Number: C277481; Supplier 1: LCSC; Category: Capacitors - MLCC; Supplier Part Number 1: C277481; Tolerance: ±10%; Voltage Rating: 50V; Temperature Coefficient: X7R; RoHS: Yes; ComponentLink1Description: Datasheet; ComponentLink1URL: https://wmsc.lcsc.com/wmsc/upload/file/pdf/v2/lcsc/2304140030_YAGEO-CC0402KRX7R9BB201_C277481.pdf; ComponentLink2Description: JLCPCB Part URL; ComponentLink2URL: https://jlcpcb.com/partdetail/C277481; ComponentLink3Description: LCSC Part URL; ComponentLink3URL: https://lcsc.com/product-detail/Multilayer-Ceramic-Capacitors-MLCC---SMD-SMT_YAGEO-YAGEO-CC0402KRX7R9BB201_C277481.html
footprint CAP-0402 (0402 (1005M) Capacitor)
pins: 1, 2

## CC0402KRX7R9BB202
designator C?  Capacitance: 2nF  (hidden comment: *)
Capacitor, Ceramic (MLCC), 2nF, ±10%, 50V, X7R, ±10%, SMD 0402; Manufacturer: YAGEO; Manufacturer Part Number: CC0402KRX7R9BB202; Package Size: 0402; JLCPCB Basic Part: No; JLCPCB Part Number: C541393; Supplier 1: LCSC; Category: Capacitors - MLCC; Supplier Part Number 1: C541393; Tolerance: ±10%; Voltage Rating: 50V; Temperature Coefficient: X7R; RoHS: Yes; ComponentLink1Description: Datasheet; ComponentLink1URL: https://wmsc.lcsc.com/wmsc/upload/file/pdf/v2/lcsc/2006151133_YAGEO-CC0402KRX7R9BB202_C541393.pdf; ComponentLink2Description: JLCPCB Part URL; ComponentLink2URL: https://jlcpcb.com/partdetail/C541393; ComponentLink3Description: LCSC Part URL; ComponentLink3URL: https://lcsc.com/product-detail/Multilayer-Ceramic-Capacitors-MLCC---SMD-SMT_YAGEO-YAGEO-CC0402KRX7R9BB202_C541393.html
footprint CAP-0402 (0402 (1005M) Capacitor)
pins: 1, 2

## CC0402KRX7R9BB221
designator C?  Capacitance: 220pF  (hidden comment: *)
Capacitor, Ceramic (MLCC), 220pF, ±10%, 50V, X7R, ±10%, SMD 0402; Manufacturer: YAGEO; Manufacturer Part Number: CC0402KRX7R9BB221; Package Size: 0402; JLCPCB Basic Part: No; JLCPCB Part Number: C107025; Supplier 1: LCSC; Category: Capacitors - MLCC; Supplier Part Number 1: C107025; Tolerance: ±10%; Voltage Rating: 50V; Temperature Coefficient: X7R; RoHS: Yes; ComponentLink1Description: Datasheet; ComponentLink1URL: https://wmsc.lcsc.com/wmsc/upload/file/pdf/v2/lcsc/2304140030_YAGEO-CC0402KRX7R9BB221_C107025.pdf; ComponentLink2Description: JLCPCB Part URL; ComponentLink2URL: https://jlcpcb.com/partdetail/C107025; ComponentLink3Description: LCSC Part URL; ComponentLink3URL: https://lcsc.com/product-detail/Multilayer-Ceramic-Capacitors-MLCC---SMD-SMT_YAGEO-YAGEO-CC0402KRX7R9BB221_C107025.html
footprint CAP-0402 (0402 (1005M) Capacitor)
pins: 1, 2

## CC0402KRX7R9BB222
designator C?  Capacitance: 2.2nF  (hidden comment: *)
Capacitor, Ceramic (MLCC), 2.2nF, ±10%, 50V, X7R, ±10%, SMD 0402; Manufacturer: YAGEO; Manufacturer Part Number: CC0402KRX7R9BB222; Package Size: 0402; JLCPCB Basic Part: No; JLCPCB Part Number: C106861; Supplier 1: LCSC; Category: Capacitors - MLCC; Supplier Part Number 1: C106861; Tolerance: ±10%; Voltage Rating: 50V; Temperature Coefficient: X7R; RoHS: Yes; ComponentLink1Description: Datasheet; ComponentLink1URL: https://wmsc.lcsc.com/wmsc/upload/file/pdf/v2/lcsc/1810241335_YAGEO-CC0402KRX7R9BB222_C106861.pdf; ComponentLink2Description: JLCPCB Part URL; ComponentLink2URL: https://jlcpcb.com/partdetail/C106861; ComponentLink3Description: LCSC Part URL; ComponentLink3URL: https://lcsc.com/product-detail/Multilayer-Ceramic-Capacitors-MLCC---SMD-SMT_YAGEO-YAGEO-CC0402KRX7R9BB222_C106861.html
footprint CAP-0402 (0402 (1005M) Capacitor)
pins: 1, 2

## CC0402KRX7R9BB223
designator C?  Capacitance: 22nF  (hidden comment: *)
Capacitor, Ceramic (MLCC), 22nF, ±10%, 50V, X7R, ±10%, SMD 0402; Manufacturer: YAGEO; Manufacturer Part Number: CC0402KRX7R9BB223; Package Size: 0402; JLCPCB Basic Part: No; JLCPCB Part Number: C107026; Supplier 1: LCSC; Category: Capacitors - MLCC; Supplier Part Number 1: C107026; Tolerance: ±10%; Voltage Rating: 50V; Temperature Coefficient: X7R; RoHS: Yes; ComponentLink1Description: Datasheet; ComponentLink1URL: https://wmsc.lcsc.com/wmsc/upload/file/pdf/v2/lcsc/2304140030_YAGEO-CC0402KRX7R9BB223_C107026.pdf; ComponentLink2Description: JLCPCB Part URL; ComponentLink2URL: https://jlcpcb.com/partdetail/C107026; ComponentLink3Description: LCSC Part URL; ComponentLink3URL: https://lcsc.com/product-detail/Multilayer-Ceramic-Capacitors-MLCC---SMD-SMT_YAGEO-YAGEO-CC0402KRX7R9BB223_C107026.html
footprint CAP-0402 (0402 (1005M) Capacitor)
pins: 1, 2

## CC0402KRX7R9BB241
designator C?  Capacitance: 240pF  (hidden comment: *)
Capacitor, Ceramic (MLCC), 240pF, ±10%, 50V, X7R, ±10%, SMD 0402; Manufacturer: YAGEO; Manufacturer Part Number: CC0402KRX7R9BB241; Package Size: 0402; JLCPCB Basic Part: No; JLCPCB Part Number: C541394; Supplier 1: LCSC; Category: Capacitors - MLCC; Supplier Part Number 1: C541394; Tolerance: ±10%; Voltage Rating: 50V; Temperature Coefficient: X7R; RoHS: Yes; ComponentLink1Description: Datasheet; ComponentLink1URL: https://wmsc.lcsc.com/wmsc/upload/file/pdf/v2/lcsc/2006151133_YAGEO-CC0402KRX7R9BB241_C541394.pdf; ComponentLink2Description: JLCPCB Part URL; ComponentLink2URL: https://jlcpcb.com/partdetail/C541394; ComponentLink3Description: LCSC Part URL; ComponentLink3URL: https://lcsc.com/product-detail/Multilayer-Ceramic-Capacitors-MLCC---SMD-SMT_YAGEO-YAGEO-CC0402KRX7R9BB241_C541394.html
footprint CAP-0402 (0402 (1005M) Capacitor)
pins: 1, 2

## CC0402KRX7R9BB271
designator C?  Capacitance: 270pF  (hidden comment: *)
Capacitor, Ceramic (MLCC), 270pF, ±10%, 50V, X7R, ±10%, SMD 0402; Manufacturer: YAGEO; Manufacturer Part Number: CC0402KRX7R9BB271; Package Size: 0402; JLCPCB Basic Part: No; JLCPCB Part Number: C107027; Supplier 1: LCSC; Category: Capacitors - MLCC; Supplier Part Number 1: C107027; Tolerance: ±10%; Voltage Rating: 50V; Temperature Coefficient: X7R; RoHS: Yes; ComponentLink1Description: Datasheet; ComponentLink1URL: https://wmsc.lcsc.com/wmsc/upload/file/pdf/v2/lcsc/2304140030_YAGEO-CC0402KRX7R9BB271_C107027.pdf; ComponentLink2Description: JLCPCB Part URL; ComponentLink2URL: https://jlcpcb.com/partdetail/C107027; ComponentLink3Description: LCSC Part URL; ComponentLink3URL: https://lcsc.com/product-detail/Multilayer-Ceramic-Capacitors-MLCC---SMD-SMT_YAGEO-YAGEO-CC0402KRX7R9BB271_C107027.html
footprint CAP-0402 (0402 (1005M) Capacitor)
pins: 1, 2

## CC0402KRX7R9BB272
designator C?  Capacitance: 2.7nF  (hidden comment: *)
Capacitor, Ceramic (MLCC), 2.7nF, ±10%, 50V, X7R, ±10%, SMD 0402; Manufacturer: YAGEO; Manufacturer Part Number: CC0402KRX7R9BB272; Package Size: 0402; JLCPCB Basic Part: No; JLCPCB Part Number: C106251; Supplier 1: LCSC; Category: Capacitors - MLCC; Supplier Part Number 1: C106251; Tolerance: ±10%; Voltage Rating: 50V; Temperature Coefficient: X7R; RoHS: Yes; ComponentLink1Description: Datasheet; ComponentLink1URL: https://wmsc.lcsc.com/wmsc/upload/file/pdf/v2/lcsc/2304140030_YAGEO-CC0402KRX7R9BB272_C106251.pdf; ComponentLink2Description: JLCPCB Part URL; ComponentLink2URL: https://jlcpcb.com/partdetail/C106251; ComponentLink3Description: LCSC Part URL; ComponentLink3URL: https://lcsc.com/product-detail/Multilayer-Ceramic-Capacitors-MLCC---SMD-SMT_YAGEO-YAGEO-CC0402KRX7R9BB272_C106251.html
footprint CAP-0402 (0402 (1005M) Capacitor)
pins: 1, 2

## CC0402KRX7R9BB273
designator C?  Capacitance: 27000pF  (hidden comment: *)
Capacitor, Ceramic (MLCC), 27000pF, null, SMD 0402; Manufacturer: YAGEO; Manufacturer Part Number: CC0402KRX7R9BB273; Package Size: 0402; JLCPCB Basic Part: No; JLCPCB Part Number: C5182418; Supplier 1: LCSC; Category: Capacitors - MLCC; Supplier Part Number 1: C5182418; Voltage Rating: null; RoHS: Yes; ComponentLink1Description: Datasheet; ComponentLink1URL: https://wmsc.lcsc.com/wmsc/upload/file/pdf/v2/lcsc/2211161830_YAGEO-CC0402KRX7R9BB273_C5182418.pdf; ComponentLink2Description: JLCPCB Part URL; ComponentLink2URL: https://jlcpcb.com/partdetail/C5182418; ComponentLink3Description: LCSC Part URL; ComponentLink3URL: https://lcsc.com/product-detail/Multilayer-Ceramic-Capacitors-MLCC---SMD-SMT_YAGEO-YAGEO-CC0402KRX7R9BB273_C5182418.html
footprint CAP-0402 (0402 (1005M) Capacitor)
pins: 1, 2

## CC0402KRX7R9BB301
designator C?  Capacitance: 300pF  (hidden comment: *)
Capacitor, Ceramic (MLCC), 300pF, ±10%, 50V, X7R, ±10%, SMD 0402; Manufacturer: YAGEO; Manufacturer Part Number: CC0402KRX7R9BB301; Package Size: 0402; JLCPCB Basic Part: No; JLCPCB Part Number: C326938; Supplier 1: LCSC; Category: Capacitors - MLCC; Supplier Part Number 1: C326938; Tolerance: ±10%; Voltage Rating: 50V; Temperature Coefficient: X7R; RoHS: Yes; ComponentLink1Description: Datasheet; ComponentLink1URL: https://wmsc.lcsc.com/wmsc/upload/file/pdf/v2/lcsc/1811061622_YAGEO-CC0402KRX7R9BB301_C326938.pdf; ComponentLink2Description: JLCPCB Part URL; ComponentLink2URL: https://jlcpcb.com/partdetail/C326938; ComponentLink3Description: LCSC Part URL; ComponentLink3URL: https://lcsc.com/product-detail/Multilayer-Ceramic-Capacitors-MLCC---SMD-SMT_YAGEO-YAGEO-CC0402KRX7R9BB301_C326938.html
footprint CAP-0402 (0402 (1005M) Capacitor)
pins: 1, 2

## CC0402KRX7R9BB331
designator C?  Capacitance: 330pF  (hidden comment: *)
Capacitor, Ceramic (MLCC), 330pF, ±10%, 50V, X7R, ±10%, SMD 0402; Manufacturer: YAGEO; Manufacturer Part Number: CC0402KRX7R9BB331; Package Size: 0402; JLCPCB Basic Part: No; JLCPCB Part Number: C106206; Supplier 1: LCSC; Category: Capacitors - MLCC; Supplier Part Number 1: C106206; Tolerance: ±10%; Voltage Rating: 50V; Temperature Coefficient: X7R; RoHS: Yes; ComponentLink1Description: Datasheet; ComponentLink1URL: https://wmsc.lcsc.com/wmsc/upload/file/pdf/v2/lcsc/2304140030_YAGEO-CC0402KRX7R9BB331_C106206.pdf; ComponentLink2Description: JLCPCB Part URL; ComponentLink2URL: https://jlcpcb.com/partdetail/C106206; ComponentLink3Description: LCSC Part URL; ComponentLink3URL: https://lcsc.com/product-detail/Multilayer-Ceramic-Capacitors-MLCC---SMD-SMT_YAGEO-YAGEO-CC0402KRX7R9BB331_C106206.html
footprint CAP-0402 (0402 (1005M) Capacitor)
pins: 1, 2
